# Altium integrated library LEMO Unipole And Multipole Type Connectors.IntLib: 1566 symbols (part 13 of 13) (continued)
## PLG.M0.6SL.NG (continued)
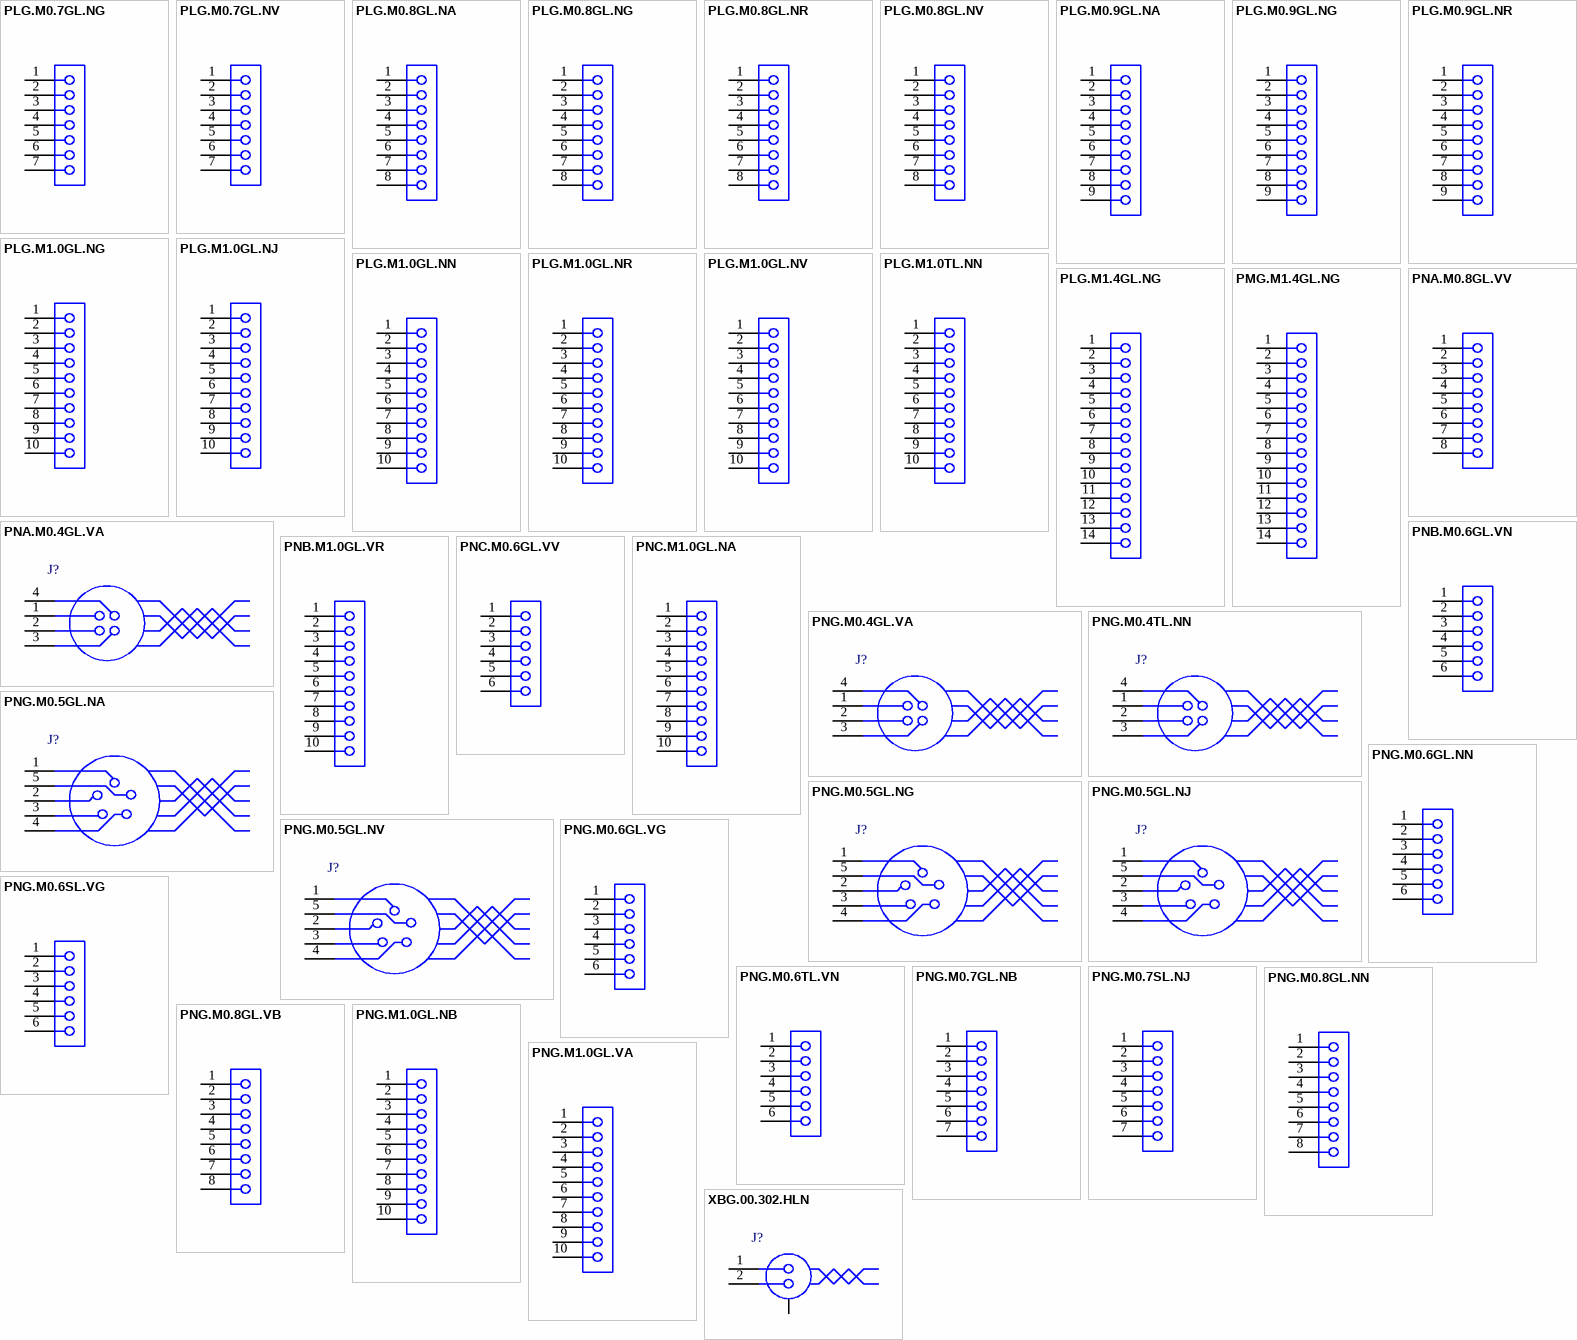
[diagram p42: symbols PLG.M0.7GL.NG to XBG.00.302.HLN]

## PLG.M0.7GL.NG
designator J?
Fixed receptacle, nut fixing, Key (G), P series, Multipole Type with 7 Contacts; Manufacturer: LEMO; PartNumber: PLG.M0.7GL.NG; Number of contacts: 7; Contact Diameter: 0.7 mm; Test voltage (kV rms) Contact-Contact: 1.05; Rated Current(A): 5; DatasheetVersion: Jun-14; PackageReference: PLG.M0.7GL.NG; PackageDescription: Fixed receptacle, nut fixing, Key(G) for Printed Circuit; ComponentLink1Description: Manufacturer URL; ComponentLink1URL: http://www.lemo.com; ComponentLink2Description: Datasheet; ComponentLink2URL: http://intra.lemo.ch/catalog/ROW/UK_English/P_series_catalog.pdf
footprint PLG.M0.7GL.NG (Socket, Female, Height 25 mm, Through hole)
pins: 1, 2, 3, 4, 5, 6, 7

## PLG.M0.7GL.NV
designator J?
Fixed receptacle, nut fixing, Key (G), P series, Multipole Type with 7 Contacts; Manufacturer: LEMO; PartNumber: PLG.M0.7GL.NV; Number of contacts: 7; Contact Diameter: 0.7 mm; Test voltage (kV rms) Contact-Contact: 1.05; Rated Current(A): 5; DatasheetVersion: Jun-14; PackageReference: PLG.M0.7GL.NV; PackageDescription: Fixed receptacle, nut fixing, Key(G) for Printed Circuit; ComponentLink1Description: Manufacturer URL; ComponentLink1URL: http://www.lemo.com; ComponentLink2Description: Datasheet; ComponentLink2URL: http://intra.lemo.ch/catalog/ROW/UK_English/P_series_catalog.pdf
footprint PLG.M0.7GL.NV (Socket, Female, Height 25 mm, Through hole)
pins: 1, 2, 3, 4, 5, 6, 7

## PLG.M0.8GL.NA
designator J?
Fixed receptacle, nut fixing, Key (G), P series, Multipole Type with 8 Contacts; Manufacturer: LEMO; PartNumber: PLG.M0.8GL.NA; Number of contacts: 8; Contact Diameter: 0.7 mm; Test voltage (kV rms) Contact-Contact: 1.05; Rated Current(A): 5; DatasheetVersion: Jun-14; PackageReference: PLG.M0.8GL.NA; PackageDescription: Fixed receptacle, nut fixing, Key(G) for Printed Circuit; ComponentLink1Description: Manufacturer URL; ComponentLink1URL: http://www.lemo.com; ComponentLink2Description: Datasheet; ComponentLink2URL: http://intra.lemo.ch/catalog/ROW/UK_English/P_series_catalog.pdf
footprint PLG.M0.8GL.NA (Socket, Female, Height 25 mm, Through hole)
pins: 1, 2, 3, 4, 5, 6, 7, 8

## PLG.M0.8GL.NG
designator J?
Fixed receptacle, nut fixing, Key (G), P series, Multipole Type with 8 Contacts; Manufacturer: LEMO; PartNumber: PLG.M0.8GL.NG; Number of contacts: 8; Contact Diameter: 0.7 mm; Test voltage (kV rms) Contact-Contact: 1.05; Rated Current(A): 5; DatasheetVersion: Jun-14; PackageReference: PLG.M0.8GL.NG; PackageDescription: Fixed receptacle, nut fixing, Key(G) for Printed Circuit; ComponentLink1Description: Manufacturer URL; ComponentLink1URL: http://www.lemo.com; ComponentLink2Description: Datasheet; ComponentLink2URL: http://intra.lemo.ch/catalog/ROW/UK_English/P_series_catalog.pdf
footprint PLG.M0.8GL.NG (Socket, Female, Height 25 mm, Through hole)
pins: 1, 2, 3, 4, 5, 6, 7, 8

## PLG.M0.8GL.NR
designator J?
Fixed receptacle, nut fixing, Key (G), P series, Multipole Type with 8 Contacts; Manufacturer: LEMO; PartNumber: PLG.M0.8GL.NR; Number of contacts: 8; Contact Diameter: 0.7 mm; Test voltage (kV rms) Contact-Contact: 1.05; Rated Current(A): 5; DatasheetVersion: Jun-14; PackageReference: PLG.M0.8GL.NR; PackageDescription: Fixed receptacle, nut fixing, Key(G) for Printed Circuit; ComponentLink1Description: Manufacturer URL; ComponentLink1URL: http://www.lemo.com; ComponentLink2Description: Datasheet; ComponentLink2URL: http://intra.lemo.ch/catalog/ROW/UK_English/P_series_catalog.pdf
footprint PLG.M0.8GL.NR (Socket, Female, Height 25 mm, Through hole)
pins: 1, 2, 3, 4, 5, 6, 7, 8

## PLG.M0.8GL.NV
designator J?
Fixed receptacle, nut fixing, Key (G), P series, Multipole Type with 8 Contacts; Manufacturer: LEMO; PartNumber: PLG.M0.8GL.NV; Number of contacts: 8; Contact Diameter: 0.7 mm; Test voltage (kV rms) Contact-Contact: 1.05; Rated Current(A): 5; DatasheetVersion: Jun-14; PackageReference: PLG.M0.8GL.NV; PackageDescription: Fixed receptacle, nut fixing, Key(G) for Printed Circuit; ComponentLink1Description: Manufacturer URL; ComponentLink1URL: http://www.lemo.com; ComponentLink2Description: Datasheet; ComponentLink2URL: http://intra.lemo.ch/catalog/ROW/UK_English/P_series_catalog.pdf
footprint PLG.M0.8GL.NV (Socket, Female, Height 25 mm, Through hole)
pins: 1, 2, 3, 4, 5, 6, 7, 8

## PLG.M0.9GL.NA
designator J?
Fixed receptacle, nut fixing, Key (G), P series, Multipole Type with 9 Contacts; Manufacturer: LEMO; PartNumber: PLG.M0.9GL.NA; Number of contacts: 9; Contact Diameter: 0.5 mm; Test voltage (kV rms) Contact-Contact: 0.85; Rated Current(A): 3; DatasheetVersion: Jun-14; PackageReference: PLG.M0.9GL.NA; PackageDescription: Fixed receptacle, nut fixing, Key(G) for Printed Circuit; ComponentLink1Description: Manufacturer URL; ComponentLink1URL: http://www.lemo.com; ComponentLink2Description: Datasheet; ComponentLink2URL: http://intra.lemo.ch/catalog/ROW/UK_English/P_series_catalog.pdf
footprint PLG.M0.9GL.NA (Socket, Female, Height 25 mm, Through hole)
pins: 1, 2, 3, 4, 5, 6, 7, 8, 9

## PLG.M0.9GL.NG
designator J?
Fixed receptacle, nut fixing, Key (G), P series, Multipole Type with 9 Contacts; Manufacturer: LEMO; PartNumber: PLG.M0.9GL.NG; Number of contacts: 9; Contact Diameter: 0.5 mm; Test voltage (kV rms) Contact-Contact: 0.85; Rated Current(A): 3; DatasheetVersion: Jun-14; PackageReference: PLG.M0.9GL.NG; PackageDescription: Fixed receptacle, nut fixing, Key(G) for Printed Circuit; ComponentLink1Description: Manufacturer URL; ComponentLink1URL: http://www.lemo.com; ComponentLink2Description: Datasheet; ComponentLink2URL: http://intra.lemo.ch/catalog/ROW/UK_English/P_series_catalog.pdf
footprint PLG.M0.9GL.NG (Socket, Female, Height 25 mm, Through hole)
pins: 1, 2, 3, 4, 5, 6, 7, 8, 9

## PLG.M0.9GL.NR
designator J?
Fixed receptacle, nut fixing, Key (G), P series, Multipole Type with 9 Contacts; Manufacturer: LEMO; PartNumber: PLG.M0.9GL.NR; Number of contacts: 9; Contact Diameter: 0.5 mm; Test voltage (kV rms) Contact-Contact: 0.85; Rated Current(A): 3; DatasheetVersion: Jun-14; PackageReference: PLG.M0.9GL.NR; PackageDescription: Fixed receptacle, nut fixing, Key(G) for Printed Circuit; ComponentLink1Description: Manufacturer URL; ComponentLink1URL: http://www.lemo.com; ComponentLink2Description: Datasheet; ComponentLink2URL: http://intra.lemo.ch/catalog/ROW/UK_English/P_series_catalog.pdf
footprint PLG.M0.9GL.NR (Socket, Female, Height 25 mm, Through hole)
pins: 1, 2, 3, 4, 5, 6, 7, 8, 9

## PLG.M1.0GL.NG
designator J?
Fixed receptacle, nut fixing, Key (G), P series, Multipole Type with 10 Contacts; Manufacturer: LEMO; PartNumber: PLG.M1.0GL.NG; Number of contacts: 10; Contact Diameter: 0.5 mm; Test voltage (kV rms) Contact-Contact: 0.85; Rated Current(A): 3; DatasheetVersion: Jun-14; PackageReference: PLG.M1.0GL.NG; PackageDescription: Fixed receptacle, nut fixing, Key(G) for Printed Circuit; ComponentLink1Description: Manufacturer URL; ComponentLink1URL: http://www.lemo.com; ComponentLink2Description: Datasheet; ComponentLink2URL: http://intra.lemo.ch/catalog/ROW/UK_English/P_series_catalog.pdf
footprint PLG.M1.0GL.NG (Socket, Female, Height 25 mm, Through hole)
pins: 1, 2, 3, 4, 5, 6, 7, 8, 9, 10

## PLG.M1.0GL.NJ
designator J?
Fixed receptacle, nut fixing, Key (G), P series, Multipole Type with 10 Contacts; Manufacturer: LEMO; PartNumber: PLG.M1.0GL.NJ; Number of contacts: 10; Contact Diameter: 0.5 mm; Test voltage (kV rms) Contact-Contact: 0.85; Rated Current(A): 3; DatasheetVersion: Jun-14; PackageReference: PLG.M1.0GL.NJ; PackageDescription: Fixed receptacle, nut fixing, Key(G) for Printed Circuit; ComponentLink1Description: Manufacturer URL; ComponentLink1URL: http://www.lemo.com; ComponentLink2Description: Datasheet; ComponentLink2URL: http://intra.lemo.ch/catalog/ROW/UK_English/P_series_catalog.pdf
footprint PLG.M1.0GL.NJ (Socket, Female, Height 25 mm, Through hole)
pins: 1, 2, 3, 4, 5, 6, 7, 8, 9, 10

## PLG.M1.0GL.NN
designator J?
Fixed receptacle, nut fixing, Key (G), P series, Multipole Type with 10 Contacts; Manufacturer: LEMO; PartNumber: PLG.M1.0GL.NN; Number of contacts: 10; Contact Diameter: 0.5 mm; Test voltage (kV rms) Contact-Contact: 0.85; Rated Current(A): 3; DatasheetVersion: Jun-14; PackageReference: PLG.M1.0GL.NN; PackageDescription: Fixed receptacle, nut fixing, Key(G) for Printed Circuit; ComponentLink1Description: Manufacturer URL; ComponentLink1URL: http://www.lemo.com; ComponentLink2Description: Datasheet; ComponentLink2URL: http://intra.lemo.ch/catalog/ROW/UK_English/P_series_catalog.pdf
footprint PLG.M1.0GL.NN (Socket, Female, Height 25 mm, Through hole)
pins: 1, 2, 3, 4, 5, 6, 7, 8, 9, 10

## PLG.M1.0GL.NR
designator J?
Fixed receptacle, nut fixing, Key (G), P series, Multipole Type with 10 Contacts; Manufacturer: LEMO; PartNumber: PLG.M1.0GL.NR; Number of contacts: 10; Contact Diameter: 0.5 mm; Test voltage (kV rms) Contact-Contact: 0.85; Rated Current(A): 3; DatasheetVersion: Jun-14; PackageReference: PLG.M1.0GL.NR; PackageDescription: Fixed receptacle, nut fixing, Key(G) for Printed Circuit; ComponentLink1Description: Manufacturer URL; ComponentLink1URL: http://www.lemo.com; ComponentLink2Description: Datasheet; ComponentLink2URL: http://intra.lemo.ch/catalog/ROW/UK_English/P_series_catalog.pdf
footprint PLG.M1.0GL.NR (Socket, Female, Height 25 mm, Through hole)
pins: 1, 2, 3, 4, 5, 6, 7, 8, 9, 10

## PLG.M1.0GL.NV
designator J?
Fixed receptacle, nut fixing, Key (G), P series, Multipole Type with 10 Contacts; Manufacturer: LEMO; PartNumber: PLG.M1.0GL.NV; Number of contacts: 10; Contact Diameter: 0.5 mm; Test voltage (kV rms) Contact-Contact: 0.85; Rated Current(A): 3; DatasheetVersion: Jun-14; PackageReference: PLG.M1.0GL.NV; PackageDescription: Fixed receptacle, nut fixing, Key(G) for Printed Circuit; ComponentLink1Description: Manufacturer URL; ComponentLink1URL: http://www.lemo.com; ComponentLink2Description: Datasheet; ComponentLink2URL: http://intra.lemo.ch/catalog/ROW/UK_English/P_series_catalog.pdf
footprint PLG.M1.0GL.NV (Socket, Female, Height 25 mm, Through hole)
pins: 1, 2, 3, 4, 5, 6, 7, 8, 9, 10

## PLG.M1.0TL.NN
designator J?
Fixed receptacle, nut fixing, Key (G), P series, Multipole Type with 10 Contacts; Manufacturer: LEMO; PartNumber: PLG.M1.0TL.NN; Number of contacts: 10; Contact Diameter: 0.5 mm; Test voltage (kV rms) Contact-Contact: 0.85; Rated Current(A): 3; DatasheetVersion: Jun-14; PackageReference: PLG.M1.0TL.NN; PackageDescription: Fixed receptacle, nut fixing, Key(G) for Printed Circuit; ComponentLink1Description: Manufacturer URL; ComponentLink1URL: http://www.lemo.com; ComponentLink2Description: Datasheet; ComponentLink2URL: http://intra.lemo.ch/catalog/ROW/UK_English/P_series_catalog.pdf
footprint PLG.M1.0TL.NN (Socket, Female, Height 25 mm, Through hole)
pins: 1, 2, 3, 4, 5, 6, 7, 8, 9, 10

## PLG.M1.4GL.NG
designator J?
Fixed receptacle, nut fixing, Key (G), P series, Multipole Type with 14 Contacts; Manufacturer: LEMO; PartNumber: PLG.M1.4GL.NG; Number of contacts: 4; Contact Diameter: 0.5 mm; Test voltage (kV rms) Contact-Contact: 0.6; Rated Current(A): 2; DatasheetVersion: Jun-14; PackageReference: PLG.M1.4GL.NG; PackageDescription: Fixed receptacle, nut fixing, Key(G) for Printed Circuit; ComponentLink1Description: Manufacturer URL; ComponentLink1URL: http://www.lemo.com; ComponentLink2Description: Datasheet; ComponentLink2URL: http://intra.lemo.ch/catalog/ROW/UK_English/P_series_catalog.pdf
footprint PLG.M1.4GL.NG (Socket, Female, Height 25 mm, Through hole)
pins: 1, 2, 3, 4, 5, 6, 7, 8, 9, 10, 11, 12, 13, 14

## PMG.M1.4GL.NG
designator J?
Fixed receptacle with square flange, Key (G), P series, Multipole Type with 14 Contacts; Manufacturer: LEMO; PartNumber: PMG.M1.4GL.NG; Number of contacts: 4; Contact Diameter: 0.5 mm; Test voltage (kV rms) Contact-Contact: 0.6; Rated Current(A): 2; DatasheetVersion: Jun-14; PackageReference: PMG.M1.4GL.NG; PackageDescription: Fixed receptacle with square flange, Key(G) for Printed Circuit; ComponentLink1Description: Manufacturer URL; ComponentLink1URL: http://www.lemo.com; ComponentLink2Description: Datasheet; ComponentLink2URL: http://intra.lemo.ch/catalog/ROW/UK_English/P_series_catalog.pdf
footprint PMG.M1.4GL.NG (Socket, Female, Height 25 mm, Through hole)
pins: 1, 2, 3, 4, 5, 6, 7, 8, 9, 10, 11, 12, 13, 14

## PNA.M0.4GL.VA
designator J?
Fixed receptacle, nut fixing, watertight,90° contacts, Key (A), P series, Multipole Type with 4 Contacts; Manufacturer: LEMO; PartNumber: PNA.M0.4GL.VA; Number of contacts: 4; Contact Diameter: 0.9 mm; Test voltage (kV rms) Contact-Contact: 1.2; Rated Current(A): 8; DatasheetVersion: Jun-14; PackageReference: PNA.M0.4GL.VA; PackageDescription: Fixed receptacle, nut fixing, watertight,90° contacts, Key(A) for Printed Circuit; ComponentLink1Description: Manufacturer URL; ComponentLink1URL: http://www.lemo.com; ComponentLink2Description: Datasheet; ComponentLink2URL: http://intra.lemo.ch/catalog/ROW/UK_English/P_series_catalog.pdf
footprint PNA.M0.4GL.VA (Socket, Female, Through hole)
pins: 1, 2, 3, 4

## PNA.M0.8GL.VV
designator J?
Fixed receptacle, nut fixing, watertight,90° contacts, Key (A), P series, Multipole Type with 8 Contacts; Manufacturer: LEMO; PartNumber: PNA.M0.8GL.VV; Number of contacts: 8; Contact Diameter: 0.7 mm; Test voltage (kV rms) Contact-Contact: 1.05; Rated Current(A): 5; DatasheetVersion: Jun-14; PackageReference: PNA.M0.8GL.VV; PackageDescription: Fixed receptacle, nut fixing, watertight,90° contacts, Key(A) for Printed Circuit; ComponentLink1Description: Manufacturer URL; ComponentLink1URL: http://www.lemo.com; ComponentLink2Description: Datasheet; ComponentLink2URL: http://intra.lemo.ch/catalog/ROW/UK_English/P_series_catalog.pdf
footprint PNA.M0.8GL.VV (Socket, Female, Through hole)
pins: 1, 2, 3, 4, 5, 6, 7, 8

## PNB.M0.6GL.VN
designator J?
Fixed receptacle, nut fixing, watertight,90° contacts, Key (B), P series, Multipole Type with 6 Contacts; Manufacturer: LEMO; PartNumber: PNB.M0.6GL.VN; Number of contacts: 6; Contact Diameter: 0.7 mm; Test voltage (kV rms) Contact-Contact: 1.05; DatasheetVersion: Jun-14; PackageReference: PNB.M0.6GL.VN; PackageDescription: Fixed receptacle, nut fixing, watertight,90° contacts, Key(B) for Printed Circuit; Rated Current(A): 6; ComponentLink1Description: Manufacturer URL; ComponentLink1URL: http://www.lemo.com; ComponentLink2Description: Datasheet; ComponentLink2URL: http://intra.lemo.ch/catalog/ROW/UK_English/P_series_catalog.pdf
footprint PNB.M0.6GL.VN (Socket, Female, Through hole)
pins: 1, 2, 3, 4, 5, 6

## PNB.M1.0GL.VR
designator J?
Fixed receptacle, nut fixing, watertight,90° contacts, Key (B), P series, Multipole Type with 10 Contacts; Manufacturer: LEMO; PartNumber: PNB.M1.0GL.VR; Number of contacts: 10; Contact Diameter: 0.5 mm; Test voltage (kV rms) Contact-Contact: 0.85; Rated Current(A): 3; DatasheetVersion: Jun-14; PackageReference: PNB.M1.0GL.VR; PackageDescription: Fixed receptacle, nut fixing, watertight,90° contacts, Key(B) for Printed Circuit; ComponentLink1Description: Manufacturer URL; ComponentLink1URL: http://www.lemo.com; ComponentLink2Description: Datasheet; ComponentLink2URL: http://intra.lemo.ch/catalog/ROW/UK_English/P_series_catalog.pdf
footprint PNB.M1.0GL.VR (Socket, Female, Through hole)
pins: 1, 2, 3, 4, 5, 6, 7, 8, 9, 10

## PNC.M0.6GL.VV
designator J?
Fixed receptacle, nut fixing, watertight,90° contacts, Key (C), P series, Multipole Type with 6 Contacts; Manufacturer: LEMO; PartNumber: PNC.M0.6GL.VV; Number of contacts: 6; Contact Diameter: 0.7 mm; Test voltage (kV rms) Contact-Contact: 1.05; DatasheetVersion: Jun-14; PackageReference: PNC.M0.6GL.VV; PackageDescription: Fixed receptacle, nut fixing, watertight,90° contacts, Key(C) for Printed Circuit; Rated Current(A): 6; ComponentLink1Description: Manufacturer URL; ComponentLink1URL: http://www.lemo.com; ComponentLink2Description: Datasheet; ComponentLink2URL: http://intra.lemo.ch/catalog/ROW/UK_English/P_series_catalog.pdf
footprint PNC.M0.6GL.VV (Socket, Female, Through hole)
pins: 1, 2, 3, 4, 5, 6

## PNC.M1.0GL.NA
designator J?
Fixed receptacle, nut fixing, watertight, Key (C), P series, Multipole Type with 10 Contacts; Manufacturer: LEMO; PartNumber: PNC.M1.0GL.NA; Number of contacts: 10; Contact Diameter: 0.5 mm; Test voltage (kV rms) Contact-Contact: 0.85; Rated Current(A): 3; DatasheetVersion: Jun-14; PackageReference: PNC.M1.0GL.NA; PackageDescription: Fixed receptacle, nut fixing, watertight, Key(C) for Printed Circuit; ComponentLink1Description: Manufacturer URL; ComponentLink1URL: http://www.lemo.com; ComponentLink2Description: Datasheet; ComponentLink2URL: http://intra.lemo.ch/catalog/ROW/UK_English/P_series_catalog.pdf
footprint PNC.M1.0GL.NA (Socket, Female, Through hole)
pins: 1, 2, 3, 4, 5, 6, 7, 8, 9, 10

## PNG.M0.4GL.VA
designator J?
Fixed receptacle, nut fixing, watertight,90° contacts, Key (G), P series, Multipole Type with 4 Contacts; Manufacturer: LEMO; PartNumber: PNG.M0.4GL.VA; Number of contacts: 4; Contact Diameter: 0.9 mm; Test voltage (kV rms) Contact-Contact: 1.2; Rated Current(A): 8; DatasheetVersion: Jun-14; PackageReference: PNG.M0.4GL.VA; PackageDescription: Fixed receptacle, nut fixing, watertight,90° contacts, Key(G) for Printed Circuit; ComponentLink1Description: Manufacturer URL; ComponentLink1URL: http://www.lemo.com; ComponentLink2Description: Datasheet; ComponentLink2URL: http://intra.lemo.ch/catalog/ROW/UK_English/P_series_catalog.pdf
footprint PNG.M0.4GL.VA (Socket, Female, Through hole)
pins: 1, 2, 3, 4

## PNG.M0.4TL.NN
designator J?
Fixed receptacle, nut fixing, watertight, Key (G), P series, Multipole Type with 4 Contacts; Manufacturer: LEMO; PartNumber: PNG.M0.4TL.NN; Number of contacts: 4; Contact Diameter: 0.9 mm; Test voltage (kV rms) Contact-Contact: 1.2; Rated Current(A): 8; DatasheetVersion: Jun-14; PackageReference: PNG.M0.4TL.NN; PackageDescription: Fixed receptacle, nut fixing, watertight, Key(G) for Printed Circuit; Supplier 1: Mouser; Supplier Part Number 1: 736-PNGM04TLNN; Supplier 2: Digi-Key; Supplier Part Number 2: PNG.M0.4TL.NN-ND; ComponentLink1Description: Manufacturer URL; ComponentLink1URL: http://www.lemo.com; ComponentLink2Description: Datasheet; ComponentLink2URL: http://intra.lemo.ch/catalog/ROW/UK_English/P_series_catalog.pdf
footprint PNG.M0.4TL.NN (Socket, Female, Through hole)
pins: 1, 2, 3, 4

## PNG.M0.5GL.NA
designator J?
Fixed receptacle, nut fixing, watertight, Key (G), P series, Multipole Type with 5 Contacts; Manufacturer: LEMO; PartNumber: PNG.M0.5GL.NA; Number of contacts: 5; Contact Diameter: 0.9 mm; Test voltage (kV rms) Contact-Contact: 1.05; Rated Current(A): 7; DatasheetVersion: Jun-14; PackageReference: PNG.M0.5GL.NA; PackageDescription: Fixed receptacle, nut fixing, watertight, Key(G) for Printed Circuit; ComponentLink1Description: Manufacturer URL; ComponentLink1URL: http://www.lemo.com; ComponentLink2Description: Datasheet; ComponentLink2URL: http://intra.lemo.ch/catalog/ROW/UK_English/P_series_catalog.pdf
footprint PNG.M0.5GL.NA (Socket, Female, Through hole)
pins: 1, 2, 3, 4, 5

## PNG.M0.5GL.NG
designator J?
Fixed receptacle, nut fixing, watertight, Key (G), P series, Multipole Type with 5 Contacts; Manufacturer: LEMO; PartNumber: PNG.M0.5GL.NG; Number of contacts: 5; Contact Diameter: 0.9 mm; Test voltage (kV rms) Contact-Contact: 1.05; Rated Current(A): 7; DatasheetVersion: Jun-14; PackageReference: PNG.M0.5GL.NG; PackageDescription: Fixed receptacle, nut fixing, watertight, Key(G) for Printed Circuit; ComponentLink1Description: Manufacturer URL; ComponentLink1URL: http://www.lemo.com; ComponentLink2Description: Datasheet; ComponentLink2URL: http://intra.lemo.ch/catalog/ROW/UK_English/P_series_catalog.pdf
footprint PNG.M0.5GL.NG (Socket, Female, Through hole)
pins: 1, 2, 3, 4, 5

## PNG.M0.5GL.NJ
designator J?
Fixed receptacle, nut fixing, watertight, Key (G), P series, Multipole Type with 5 Contacts; Manufacturer: LEMO; PartNumber: PNG.M0.5GL.NJ; Number of contacts: 5; Contact Diameter: 0.9 mm; Test voltage (kV rms) Contact-Contact: 1.05; Rated Current(A): 7; DatasheetVersion: Jun-14; PackageReference: PNG.M0.5GL.NJ; PackageDescription: Fixed receptacle, nut fixing, watertight, Key(G) for Printed Circuit; ComponentLink1Description: Manufacturer URL; ComponentLink1URL: http://www.lemo.com; ComponentLink2Description: Datasheet; ComponentLink2URL: http://intra.lemo.ch/catalog/ROW/UK_English/P_series_catalog.pdf
footprint PNG.M0.5GL.NJ (Socket, Female, Through hole)
pins: 1, 2, 3, 4, 5

## PNG.M0.5GL.NV
designator J?
Fixed receptacle, nut fixing, watertight, Key (G), P series, Multipole Type with 5 Contacts; Manufacturer: LEMO; PartNumber: PNG.M0.5GL.NV; Number of contacts: 5; Contact Diameter: 0.9 mm; Test voltage (kV rms) Contact-Contact: 1.05; Rated Current(A): 7; DatasheetVersion: Jun-14; PackageReference: PNG.M0.5GL.NV; PackageDescription: Fixed receptacle, nut fixing, watertight, Key(G) for Printed Circuit; ComponentLink1Description: Manufacturer URL; ComponentLink1URL: http://www.lemo.com; ComponentLink2Description: Datasheet; ComponentLink2URL: http://intra.lemo.ch/catalog/ROW/UK_English/P_series_catalog.pdf
footprint PNG.M0.5GL.NV (Socket, Female, Through hole)
pins: 1, 2, 3, 4, 5

## PNG.M0.6GL.NN
designator J?
Fixed receptacle, nut fixing, watertight, Key (G), P series, Multipole Type with 6 Contacts; Manufacturer: LEMO; PartNumber: PNG.M0.6GL.NN; Number of contacts: 6; Contact Diameter: 0.7 mm; Test voltage (kV rms) Contact-Contact: 1.05; DatasheetVersion: Jun-14; PackageReference: PNG.M0.6GL.NN; PackageDescription: Fixed receptacle, nut fixing, watertight, Key(G) for Printed Circuit; Rated Current(A): 6; ComponentLink1Description: Manufacturer URL; ComponentLink1URL: http://www.lemo.com; ComponentLink2Description: Datasheet; ComponentLink2URL: http://intra.lemo.ch/catalog/ROW/UK_English/P_series_catalog.pdf
footprint PNG.M0.6GL.NN (Socket, Female, Through hole)
pins: 1, 2, 3, 4, 5, 6

## PNG.M0.6GL.VG
designator J?
Fixed receptacle, nut fixing, watertight,90° contacts, Key (G), P series, Multipole Type with 6 Contacts; Manufacturer: LEMO; PartNumber: PNG.M0.6GL.VG; Number of contacts: 6; Contact Diameter: 0.7 mm; Test voltage (kV rms) Contact-Contact: 1.05; DatasheetVersion: Jun-14; PackageReference: PNG.M0.6GL.VG; PackageDescription: Fixed receptacle, nut fixing, watertight,90° contacts, Key(G) for Printed Circuit; Rated Current(A): 6; ComponentLink1Description: Manufacturer URL; ComponentLink1URL: http://www.lemo.com; ComponentLink2Description: Datasheet; ComponentLink2URL: http://intra.lemo.ch/catalog/ROW/UK_English/P_series_catalog.pdf
footprint PNG.M0.6GL.VG (Socket, Female, Through hole)
pins: 1, 2, 3, 4, 5, 6

## PNG.M0.6SL.VG
designator J?
Fixed receptacle, nut fixing, watertight,90° contacts, Key (G), P series, Multipole Type with 6 Contacts; Manufacturer: LEMO; PartNumber: PNG.M0.6SL.VG; Number of contacts: 6; Contact Diameter: 0.7 mm; Test voltage (kV rms) Contact-Contact: 1.05; DatasheetVersion: Jun-14; PackageReference: PNG.M0.6SL.VG; PackageDescription: Fixed receptacle, nut fixing, watertight,90° contacts, Key(G) for Printed Circuit; Rated Current(A): 6; ComponentLink1Description: Manufacturer URL; ComponentLink1URL: http://www.lemo.com; ComponentLink2Description: Datasheet; ComponentLink2URL: http://intra.lemo.ch/catalog/ROW/UK_English/P_series_catalog.pdf
footprint PNG.M0.6SL.VG (Socket, Female, Through hole)
pins: 1, 2, 3, 4, 5, 6

## PNG.M0.6TL.VN
designator J?
Fixed receptacle, nut fixing, watertight,90° contacts, Key (G), P series, Multipole Type with 6 Contacts; Manufacturer: LEMO; PartNumber: PNG.M0.6TL.VN; Number of contacts: 6; Contact Diameter: 0.7 mm; Test voltage (kV rms) Contact-Contact: 1.05; DatasheetVersion: Jun-14; PackageReference: PNG.M0.6TL.VN; PackageDescription: Fixed receptacle, nut fixing, watertight,90° contacts, Key(G) for Printed Circuit; Rated Current(A): 6; ComponentLink1Description: Manufacturer URL; ComponentLink1URL: http://www.lemo.com; ComponentLink2Description: Datasheet; ComponentLink2URL: http://intra.lemo.ch/catalog/ROW/UK_English/P_series_catalog.pdf
footprint PNG.M0.6TL.VN (Socket, Female, Through hole)
pins: 1, 2, 3, 4, 5, 6

## PNG.M0.7GL.NB
designator J?
Fixed receptacle, nut fixing, watertight, Key (G), P series, Multipole Type with 7 Contacts; Manufacturer: LEMO; PartNumber: PNG.M0.7GL.NB; Number of contacts: 7; Contact Diameter: 0.7 mm; Test voltage (kV rms) Contact-Contact: 1.05; Rated Current(A): 5; DatasheetVersion: Jun-14; PackageReference: PNG.M0.7GL.NB; PackageDescription: Fixed receptacle, nut fixing, watertight, Key(G) for Printed Circuit; ComponentLink1Description: Manufacturer URL; ComponentLink1URL: http://www.lemo.com; ComponentLink2Description: Datasheet; ComponentLink2URL: http://intra.lemo.ch/catalog/ROW/UK_English/P_series_catalog.pdf
footprint PNG.M0.7GL.NB (Socket, Female, Through hole)
pins: 1, 2, 3, 4, 5, 6, 7

## PNG.M0.7SL.NJ
designator J?
Fixed receptacle, nut fixing, watertight, Key (G), P series, Multipole Type with 7 Contacts; Manufacturer: LEMO; PartNumber: PNG.M0.7SL.NJ; Number of contacts: 7; Contact Diameter: 0.7 mm; Test voltage (kV rms) Contact-Contact: 1.05; Rated Current(A): 5; DatasheetVersion: Jun-14; PackageReference: PNG.M0.7SL.NJ; PackageDescription: Fixed receptacle, nut fixing, watertight, Key(G) for Printed Circuit; Supplier 1: Mouser; Supplier Part Number 1: 736-PNGM07SLNJ; Supplier 2: Digi-Key; Supplier Part Number 2: PNG.M0.7SL.NJ-ND; ComponentLink1Description: Manufacturer URL; ComponentLink1URL: http://www.lemo.com; ComponentLink2Description: Datasheet; ComponentLink2URL: http://intra.lemo.ch/catalog/ROW/UK_English/P_series_catalog.pdf
footprint PNG.M0.7SL.NJ (Socket, Female, Through hole)
pins: 1, 2, 3, 4, 5, 6, 7

## PNG.M0.8GL.NN
designator J?
Fixed receptacle, nut fixing, watertight, Key (G), P series, Multipole Type with 8 Contacts; Manufacturer: LEMO; PartNumber: PNG.M0.8GL.NN; Number of contacts: 8; Contact Diameter: 0.7 mm; Test voltage (kV rms) Contact-Contact: 1.05; Rated Current(A): 5; DatasheetVersion: Jun-14; PackageReference: PNG.M0.8GL.NN; PackageDescription: Fixed receptacle, nut fixing, watertight, Key(G) for Printed Circuit; ComponentLink1Description: Manufacturer URL; ComponentLink1URL: http://www.lemo.com; ComponentLink2Description: Datasheet; ComponentLink2URL: http://intra.lemo.ch/catalog/ROW/UK_English/P_series_catalog.pdf
footprint PNG.M0.8GL.NN (Socket, Female, Through hole)
pins: 1, 2, 3, 4, 5, 6, 7, 8

## PNG.M0.8GL.VB
designator J?
Fixed receptacle, nut fixing, watertight,90° contacts, Key (G), P series, Multipole Type with 8 Contacts; Manufacturer: LEMO; PartNumber: PNG.M0.8GL.VB; Number of contacts: 8; Contact Diameter: 0.7 mm; Test voltage (kV rms) Contact-Contact: 1.05; Rated Current(A): 5; DatasheetVersion: Jun-14; PackageReference: PNG.M0.8GL.VB; PackageDescription: Fixed receptacle, nut fixing, watertight,90° contacts, Key(G) for Printed Circuit; ComponentLink1Description: Manufacturer URL; ComponentLink1URL: http://www.lemo.com; ComponentLink2Description: Datasheet; ComponentLink2URL: http://intra.lemo.ch/catalog/ROW/UK_English/P_series_catalog.pdf
footprint PNG.M0.8GL.VB (Socket, Female, Through hole)
pins: 1, 2, 3, 4, 5, 6, 7, 8

## PNG.M1.0GL.NB
designator J?
Fixed receptacle, nut fixing, watertight, Key (G), P series, Multipole Type with 10 Contacts; Manufacturer: LEMO; PartNumber: PNG.M1.0GL.NB; Number of contacts: 10; Contact Diameter: 0.5 mm; Test voltage (kV rms) Contact-Contact: 0.85; Rated Current(A): 3; DatasheetVersion: Jun-14; PackageReference: PNG.M1.0GL.NB; PackageDescription: Fixed receptacle, nut fixing, watertight, Key(G) for Printed Circuit; ComponentLink1Description: Manufacturer URL; ComponentLink1URL: http://www.lemo.com; ComponentLink2Description: Datasheet; ComponentLink2URL: http://intra.lemo.ch/catalog/ROW/UK_English/P_series_catalog.pdf
footprint PNG.M1.0GL.NB (Socket, Female, Through hole)
pins: 1, 2, 3, 4, 5, 6, 7, 8, 9, 10

## PNG.M1.0GL.VA
designator J?
Fixed receptacle, nut fixing, watertight,90° contacts, Key (G), P series, Multipole Type with 10 Contacts; Manufacturer: LEMO; PartNumber: PNG.M1.0GL.VA; Number of contacts: 10; Contact Diameter: 0.5 mm; Test voltage (kV rms) Contact-Contact: 0.85; Rated Current(A): 3; DatasheetVersion: Jun-14; PackageReference: PNG.M1.0GL.VA; PackageDescription: Fixed receptacle, nut fixing, watertight,90° contacts, Key(G) for Printed Circuit; ComponentLink1Description: Manufacturer URL; ComponentLink1URL: http://www.lemo.com; ComponentLink2Description: Datasheet; ComponentLink2URL: http://intra.lemo.ch/catalog/ROW/UK_English/P_series_catalog.pdf
footprint PNG.M1.0GL.VA (Socket, Female, Through hole)
pins: 1, 2, 3, 4, 5, 6, 7, 8, 9, 10

## XBG.00.302.HLN
designator J?
Elbow receptacle fixing nut for printed circuit (back panel mounting), Key (G), 00 series, Multipole Type with 2 Contacts; Manufacturer: LEMO; PartNumber: XBG.00.302.HLN; Number of contacts: 2; Contact Diameter: 0.5 mm; AWG: 28; DatasheetVersion: Jun-14; PackageReference: XBG.00.302.HLN; PackageDescription: Elbow receptacle fixing nut for printed circuit (back panel mounting), Key(G) for Printed Circuit; Supplier 1: Mouser; Supplier Part Number 1: 736-XBG00302HLN; Supplier 2: Digi-Key; Supplier Part Number 2: XBG.00.302.HLN-ND; Rated Current(A): 2; ComponentLink1Description: Manufacturer URL; ComponentLink1URL: http://www.lemo.com; ComponentLink2Description: Datasheet; ComponentLink2URL: http://intra.lemo.ch/catalog/ROW/UK_English/unipole_multipole.pdf
footprint XBG.00.302.HLN (Socket, Female, Body 7mm dia. Height 17.5 mm, Through hole)
pins: 1, 2, 4, 5, 6, 7

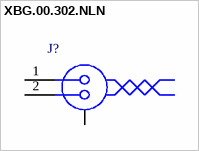
[diagram p43: symbol XBG.00.302.NLN]

## XBG.00.302.NLN
designator J?
Elbow receptacle fixing nut for printed circuit (back panel mounting), Key (G), 00 series, Multipole Type with 2 Contacts; Manufacturer: LEMO; PartNumber: XBG.00.302.NLN; Number of contacts: 3; Contact Diameter: 0.5 mm; AWG: 28; Rated Current(A): 2; DatasheetVersion: Jun-14; PackageReference: XBG.00.302.NLN; PackageDescription: Elbow receptacle fixing nut for printed circuit (back panel mounting), Key(G) for Printed Circuit; Supplier 1: Mouser; Supplier Part Number 1: 736-XBG00302NLN; Supplier 2: Digi-Key; Supplier Part Number 2: XBG.00.302.NLN-ND; ComponentLink1Description: Manufacturer URL; ComponentLink1URL: http://www.lemo.com; ComponentLink2Description: Datasheet; ComponentLink2URL: http://intra.lemo.ch/catalog/ROW/UK_English/unipole_multipole.pdf
footprint XBG.00.302.NLN (Socket, Female, Body 7mm dia. Height 17.5 mm, Through hole)
pins: 1, 2, 4, 5, 6, 7